# Altium footprint library Wurth_Elektronik_Electromechanic_Wire_to_Board_Connectors_rev16a.PCBLIB: 662 footprints (part 8 of 42)
Each footprint in its own frame and in the unit in brackets; x right, y up, seen from the top. Pads: shape width x height; smd on the part's side, far side on the other; paste and mask are expansions set on the pad; w line width, h text height; cw(c..) or ccw(c..) is an arc to the next point about the centre after c.
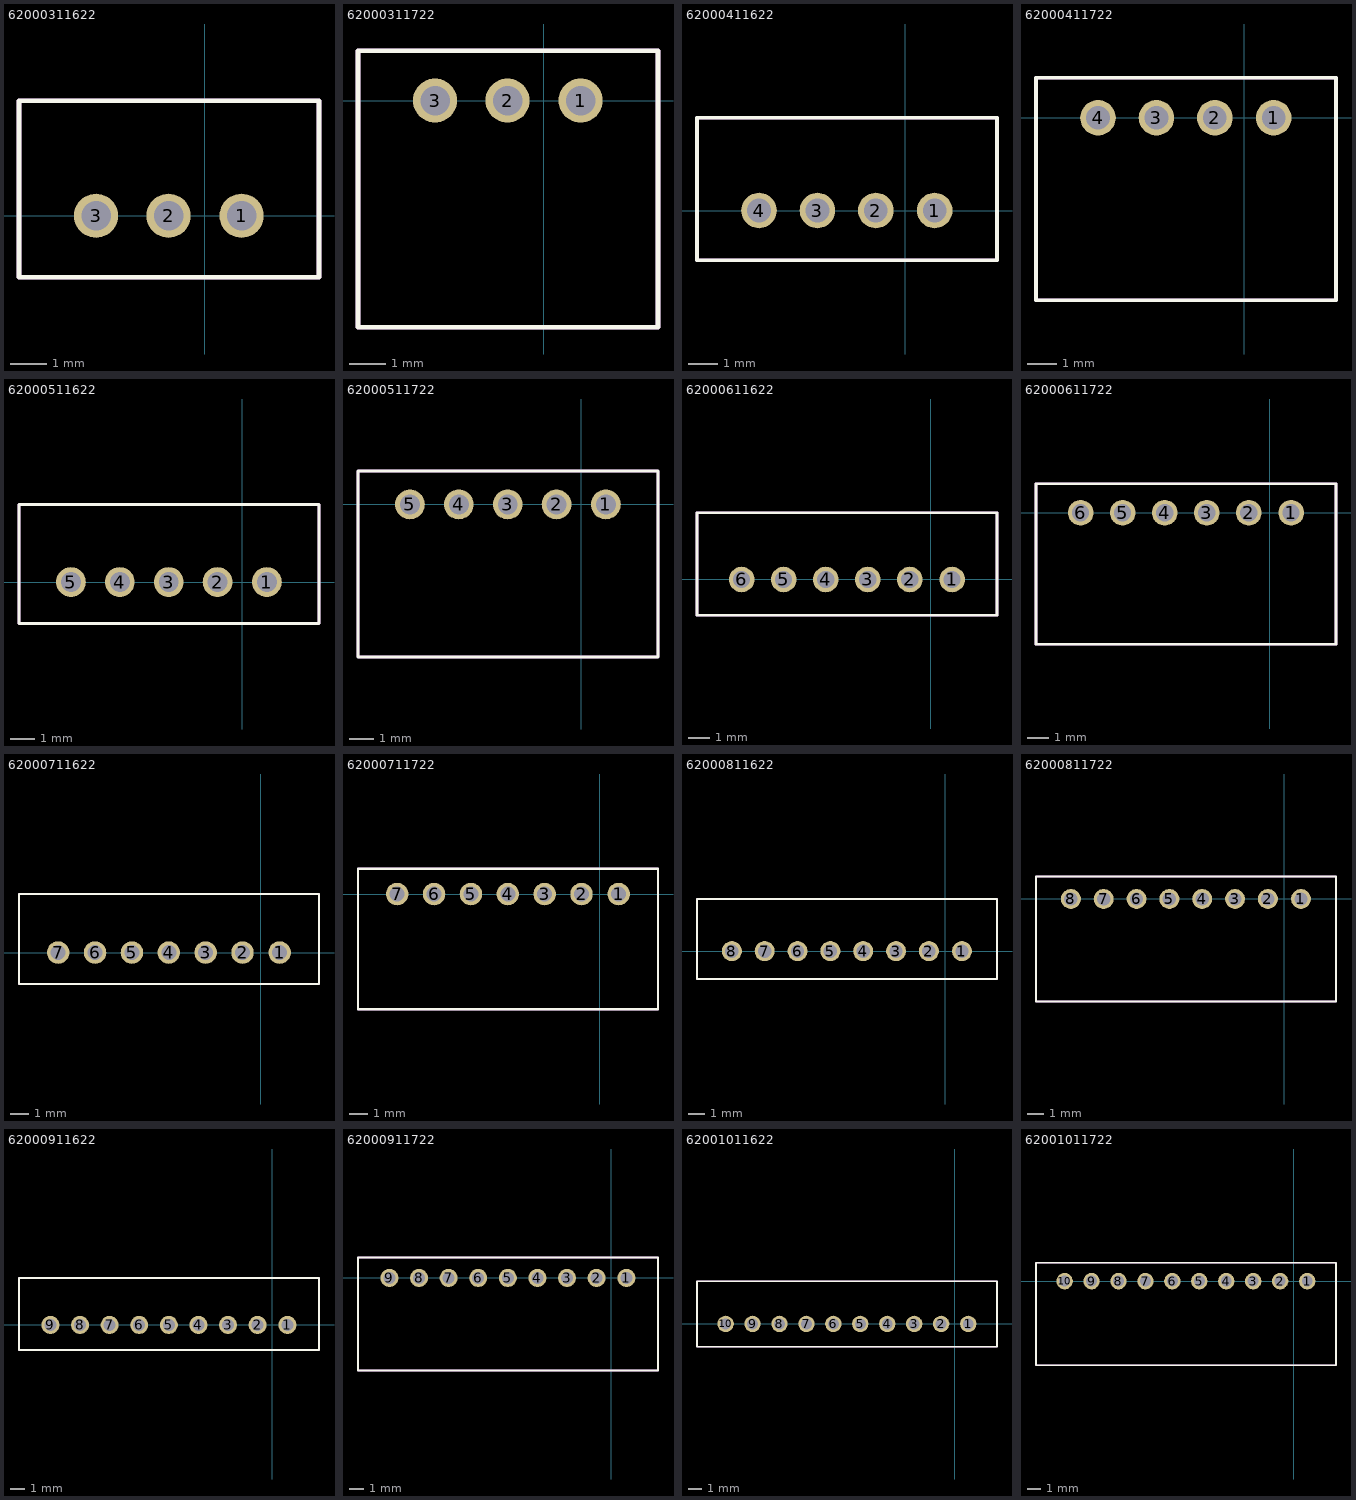
[diagram p7: the footprints below, top view; thin cyan lines are the x and y axes]

## 62000311622 [mil]
pads (3):
  round 48 hole 32: 1(40,0) 2(-39.37,0) 3(-118.11,0)
Top Overlay:
  lines w5: -201.77,-66.93 124,-66.93 124,125 -201.77,125 -201.77,-66.93
Mechanical 2:
  text ">NAME" at 150,-1.97 h77.5
Mechanical 4:
  text ">VALUE" at 158,-79.92 h77.5
Mechanical 16:
  lines w5: -201.77,-66.93 124,-66.93 124,125 -201.77,125 -201.77,-66.93
  text "1" at 20,-19.68 h77.5
  text "3" at -137.8,-19.68 h77.5

## 62000311722 [mil]
pads (3):
  round 48 hole 32: 1(40,0) 2(-39.37,0) 3(-118.11,0)
Top Overlay:
  lines w5: -201.77,-246.06 124,-246.06 124,54 -201.77,54 -201.77,-246.06
Mechanical 2:
  text ">NAME" at 150,-1.97 h77.5
Mechanical 4:
  text ">VALUE" at 158,-79.92 h77.5
Mechanical 16:
  lines w5: -201.77,-246.06 124,-246.06 124,54 -201.77,54 -201.77,-246.06
  text "1" at 20,-19.68 h77.5
  text "3" at -137.8,-19.68 h77.5

## 62000411622 [mil]
pads (4):
  round 48 hole 32: 1(40,0) 2(-39.37,0) 3(-118.11,0) 4(-196.85,0)
Top Overlay:
  lines w5: -280.51,-66.93 124,-66.93 124,125 -280.51,125 -280.51,-66.93
Mechanical 2:
  text ">NAME" at 150,-1.97 h77.5
Mechanical 4:
  text ">VALUE" at 158,-79.92 h77.5
Mechanical 16:
  lines w5: -280.51,-66.93 124,-66.93 124,125 -280.51,125 -280.51,-66.93
  text "1" at 20,-19.68 h77.5
  text "4" at -216.54,-19.68 h77.5

## 62000411722 [mil]
pads (4):
  round 48 hole 32: 1(40,0) 2(-39.37,0) 3(-118.11,0) 4(-196.85,0)
Top Overlay:
  lines w5: -280.51,-246.06 124,-246.06 124,54 -280.51,54 -280.51,-246.06
Mechanical 2:
  text ">NAME" at 150,-1.97 h77.5
Mechanical 4:
  text ">VALUE" at 158,-79.92 h77.5
Mechanical 16:
  lines w5: -280.51,-246.06 124,-246.06 124,54 -280.51,54 -280.51,-246.06
  text "1" at 20,-19.68 h77.5
  text "4" at -216.54,-19.68 h77.5

## 62000511622 [mil]
pads (5):
  round 48 hole 32: 1(40,0) 2(-39.37,0) 3(-118.11,0) 4(-196.85,0) 5(-275.59,0)
Top Overlay:
  lines w5: -359.25,-66.93 124,-66.93 124,125 -359.25,125 -359.25,-66.93
Mechanical 2:
  text ">NAME" at 150,-1.97 h77.5
Mechanical 4:
  text ">VALUE" at 158,-79.92 h77.5
Mechanical 16:
  lines w5: -359.25,-66.93 124,-66.93 124,125 -359.25,125 -359.25,-66.93
  text "1" at 20,-19.68 h77.5
  text "5" at -295.28,-19.68 h77.5

## 62000511722 [mil]
pads (5):
  round 48 hole 32: 1(40,0) 2(-39.37,0) 3(-118.11,0) 4(-196.85,0) 5(-275.59,0)
Top Overlay:
  lines w5: -359.25,-246.06 124,-246.06 124,54 -359.25,54 -359.25,-246.06
Mechanical 2:
  text ">NAME" at 150,-1.97 h77.5
Mechanical 4:
  text ">VALUE" at 158,-79.92 h77.5
Mechanical 16:
  lines w5: -359.25,-246.06 124,-246.06 124,54 -359.25,54 -359.25,-246.06
  text "1" at 20,-19.68 h77.5
  text "5" at -295.28,-19.68 h77.5

## 62000611622 [mil]
pads (6):
  round 48 hole 32: 1(40,0) 2(-39.37,0) 3(-118.11,0) 4(-196.85,0) 5(-275.59,0) 6(-354.33,0)
Top Overlay:
  lines w5: -437.99,-66.93 124,-66.93 124,125 -437.99,125 -437.99,-66.93
Mechanical 2:
  text ">NAME" at 150,-1.97 h77.5
Mechanical 4:
  text ">VALUE" at 158,-79.92 h77.5
Mechanical 16:
  lines w5: -437.99,-66.93 124,-66.93 124,125 -437.99,125 -437.99,-66.93
  text "1" at 20,-19.68 h77.5
  text "6" at -374.02,-19.68 h77.5

## 62000611722 [mil]
pads (6):
  round 48 hole 32: 1(40,0) 2(-39.37,0) 3(-118.11,0) 4(-196.85,0) 5(-275.59,0) 6(-354.33,0)
Top Overlay:
  lines w5: -437.99,-246.06 124,-246.06 124,54 -437.99,54 -437.99,-246.06
Mechanical 2:
  text ">NAME" at 150,-1.97 h77.5
Mechanical 4:
  text ">VALUE" at 158,-79.92 h77.5
Mechanical 16:
  lines w5: -437.99,-246.06 124,-246.06 124,54 -437.99,54 -437.99,-246.06
  text "1" at 20,-19.68 h77.5
  text "6" at -374.02,-19.68 h77.5

## 62000711622 [mil]
pads (7):
  round 48 hole 32: 1(40,0) 2(-39.37,0) 3(-118.11,0) 4(-196.85,0) 5(-275.59,0) 6(-354.33,0) 7(-433.07,0)
Top Overlay:
  lines w5: -516.73,-66.93 124,-66.93 124,125 -516.73,125 -516.73,-66.93
Mechanical 2:
  text ">NAME" at 150,-1.97 h77.5
Mechanical 4:
  text ">VALUE" at 158,-79.92 h77.5
Mechanical 16:
  lines w5: -516.73,-66.93 124,-66.93 124,125 -516.73,125 -516.73,-66.93
  text "1" at 20,-19.68 h77.5
  text "7" at -452.76,-39.37 h77.5

## 62000711722 [mil]
pads (7):
  round 48 hole 32: 1(40,0) 2(-39.37,0) 3(-118.11,0) 4(-196.85,0) 5(-275.59,0) 6(-354.33,0) 7(-433.07,0)
Top Overlay:
  lines w5: -516.73,-246.06 124,-246.06 124,54 -516.73,54 -516.73,-246.06
Mechanical 2:
  text ">NAME" at 150,-1.97 h77.5
Mechanical 4:
  text ">VALUE" at 158,-79.92 h77.5
Mechanical 16:
  lines w5: -516.73,-246.06 124,-246.06 124,54 -516.73,54 -516.73,-246.06
  text "1" at 20,-19.68 h77.5
  text "7" at -452.76,-19.68 h77.5

## 62000811622 [mil]
pads (8):
  round 48 hole 32: 1(40,0) 2(-39.37,0) 3(-118.11,0) 4(-196.85,0) 5(-275.59,0) 6(-354.33,0) 7(-433.07,0) 8(-511.81,0)
Top Overlay:
  lines w5: -595.47,-66.93 124,-66.93 124,125 -595.47,125 -595.47,-66.93
Mechanical 2:
  text ">NAME" at 150,-1.97 h77.5
Mechanical 4:
  text ">VALUE" at 158,-79.92 h77.5
Mechanical 16:
  lines w5: -595.47,-66.93 124,-66.93 124,125 -595.47,125 -595.47,-66.93
  text "1" at 20,-19.68 h77.5
  text "8" at -531.5,-19.68 h77.5

## 62000811722 [mil]
pads (8):
  round 48 hole 32: 1(40,0) 2(-39.37,0) 3(-118.11,0) 4(-196.85,0) 5(-275.59,0) 6(-354.33,0) 7(-433.07,0) 8(-511.81,0)
Top Overlay:
  lines w5: -595.47,-246.06 124,-246.06 124,54 -595.47,54 -595.47,-246.06
Mechanical 2:
  text ">NAME" at 150,-1.97 h77.5
Mechanical 4:
  text ">VALUE" at 158,-79.92 h77.5
Mechanical 16:
  lines w5: -595.47,-246.06 124,-246.06 124,54 -595.47,54 -595.47,-246.06
  text "1" at 20,-19.68 h77.5
  text "8" at -531.5,-19.68 h77.5

## 62000911622 [mil]
pads (9):
  round 48 hole 32: 1(40,0) 2(-39.37,0) 3(-118.11,0) 4(-196.85,0) 5(-275.59,0) 6(-354.33,0) 7(-433.07,0) 8(-511.81,0) 9(-590.55,0)
Top Overlay:
  lines w5: -674.21,-66.93 124,-66.93 124,125 -674.21,125 -674.21,-66.93
Mechanical 2:
  text ">NAME" at 150,-1.97 h77.5
Mechanical 4:
  text ">VALUE" at 158,-79.92 h77.5
Mechanical 16:
  lines w5: -674.21,-66.93 124,-66.93 124,125 -674.21,125 -674.21,-66.93
  text "1" at 20,-19.68 h77.5
  text "9" at -610.24,-19.68 h77.5

## 62000911722 [mil]
pads (9):
  round 48 hole 32: 1(40,0) 2(-39.37,0) 3(-118.11,0) 4(-196.85,0) 5(-275.59,0) 6(-354.33,0) 7(-433.07,0) 8(-511.81,0) 9(-590.55,0)
Top Overlay:
  lines w5: -674.21,-246.06 124,-246.06 124,54 -674.21,54 -674.21,-246.06
Mechanical 2:
  text ">NAME" at 150,-1.97 h77.5
Mechanical 4:
  text ">VALUE" at 158,-79.92 h77.5
Mechanical 16:
  lines w5: -674.21,-246.06 124,-246.06 124,54 -674.21,54 -674.21,-246.06
  text "1" at 20,-19.68 h77.5
  text "9" at -610.24,-19.68 h77.5

## 62001011622 [mil]
pads (10):
  round 48 hole 32: 1(40,0) 2(-39.37,0) 3(-118.11,0) 4(-196.85,0) 5(-275.59,0) 6(-354.33,0) 7(-433.07,0) 8(-511.81,0) 9(-590.55,0) 10(-669.29,0)
Top Overlay:
  lines w5: -752.95,-66.93 124,-66.93 124,125 -752.95,125 -752.95,-66.93
Mechanical 2:
  text ">NAME" at 150,-1.97 h77.5
Mechanical 4:
  text ">VALUE" at 158,-79.92 h77.5
Mechanical 16:
  lines w5: -752.95,-66.93 124,-66.93 124,125 -752.95,125 -752.95,-66.93
  text "1" at 20,-19.68 h77.5
  text "10" at -708.66,-19.68 h77.5

## 62001011722 [mil]
pads (10):
  round 48 hole 32: 1(40,0) 2(-39.37,0) 3(-118.11,0) 4(-196.85,0) 5(-275.59,0) 6(-354.33,0) 7(-433.07,0) 8(-511.81,0) 9(-590.55,0) 10(-669.29,0)
Top Overlay:
  lines w5: -752.95,-246.06 124,-246.06 124,54 -752.95,54 -752.95,-246.06
Mechanical 2:
  text ">NAME" at 150,-1.97 h77.5
Mechanical 4:
  text ">VALUE" at 158,-79.92 h77.5
Mechanical 16:
  lines w5: -752.95,-246.06 124,-246.06 124,54 -752.95,54 -752.95,-246.06
  text "1" at 20,-19.68 h77.5
  text "10" at -708.66,-19.68 h77.5